# Altium footprint library UltraZOhm_CarrierBoard.PcbLib: 71 footprints (part 4 of 5)
Each footprint in its own frame and in the unit in brackets; x right, y up, seen from the top. Pads: shape width x height; smd on the part's side, far side on the other; paste and mask are expansions set on the pad; w line width, h text height; cw(c..) or ccw(c..) is an arc to the next point about the centre after c.
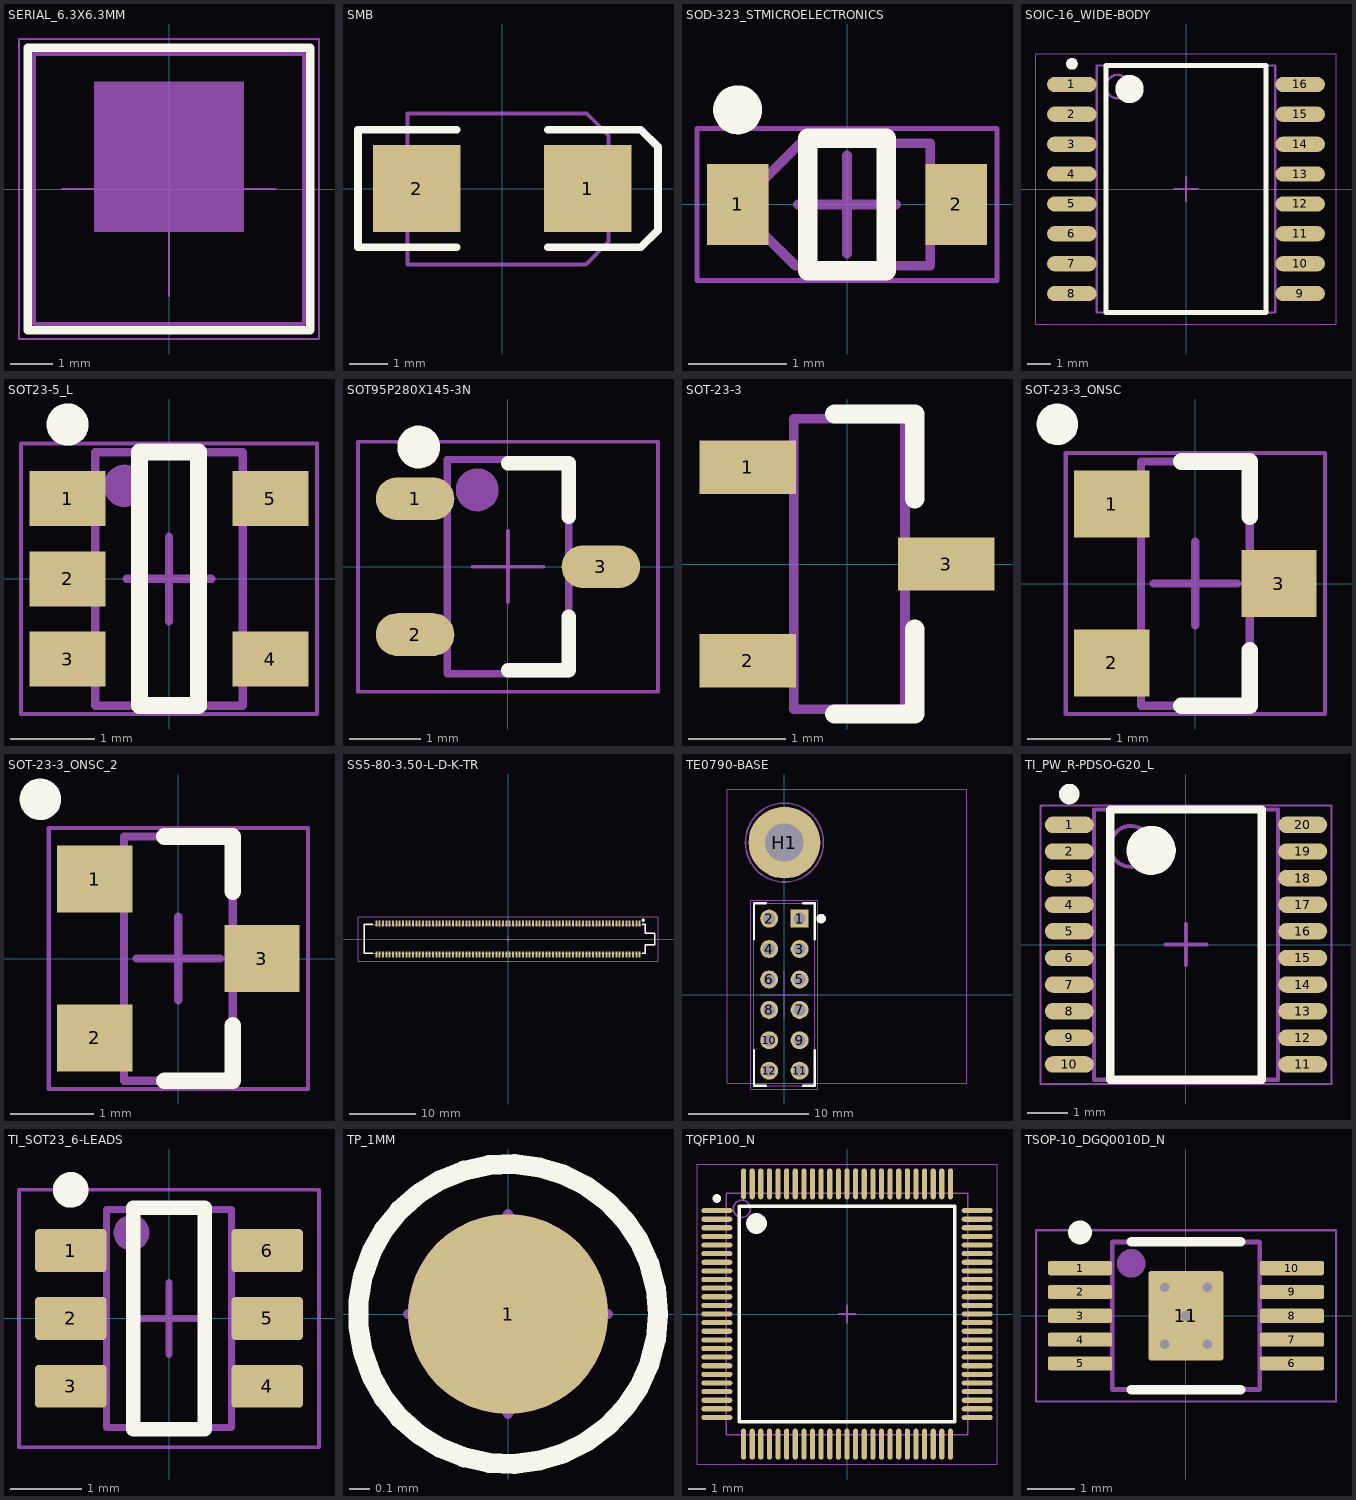
[diagram p3: the footprints below, top view; thin cyan lines are the x and y axes]

## SERIAL_6.3X6.3MM [mm]
Top Overlay:
  lines w0.2: -3.3,-3.3 -3.3,3.3 3.3,3.3 3.3,-3.3 -3.3,-3.3
Mechanical 5:
  region: -1.75,2.5 -1.75,-1 1.75,-1 1.75,2.5
  lines w0.1: -3.15,-3.15 3.15,-3.15 3.15,3.15 -3.15,3.15 -3.15,-3.15
  text "SerialNr" at 2.5,-1.7 h0.7
Mechanical 15:
  lines w0.05: -2.5,0 2.5,0 ; 0,-2.5 0,2.5 ; -3.5,-3.5 -3.5,3.5 3.5,3.5 3.5,-3.5 -3.5,-3.5

## SMB [mm]
pads (2):
  rect 2.3x2.3 smd: 1(2.25,0) 2(-2.25,0)
Top Overlay:
  lines w0.2: -1.2,-1.55 -3.8,-1.55 -3.8,1.55 -1.2,1.55 ; 1.2,-1.55 3.65,-1.55 4.1,-1.1 4.1,1.1 3.65,1.55 1.2,1.55
Mechanical 5:
  lines w0.1: -2.5,-2 2.2,-2 2.8,-1.4 2.8,1.4 2.225,1.975 -2.5,1.975 -2.5,-2
  text ".Designator" at -1.824,-0.8 h1.52
3D body "DIOM4336X25N.step": height 2.47, standoff 0, extent -2.52,-1.975 2.52,1.975

## SOD-323_STMICROELECTRONICS [mm]
pads (2):
  rect 0.63x0.83 smd: 1(-1.115,0) 2(1.115,0)
Top Overlay:
  circle w0.25: c-1.115,0.965 r0.125
  lines w0.2: -0.4,-0.675 0.4,-0.675 0.4,0.675 -0.4,0.675 -0.4,-0.675
Mechanical 5:
  lines w0.1: -0.85,-0.3 -0.85,0.25 -0.475,0.625 0.85,0.625 0.85,-0.625 -0.525,-0.625 -0.85,-0.3
  text ".Designator" at -0.624,-0.3 h0.51
Mechanical 15:
  lines w0.05: -1.53,-0.775 1.53,-0.775 1.53,0.775 -1.53,0.775 -1.53,-0.775
  lines w0.1: -0.5,0 0.5,0 ; 0,-0.5 0,0.5
3D body: height 1.06, standoff 0, extent -0.85,-0.625 0.85,0.625

## SOIC-16_WIDE-BODY [mm]
pads (16):
  oval 2.1x0.65 smd: 1(-4.85,4.445) 2(-4.85,3.175) 3(-4.85,1.905) 4(-4.85,0.635) 5(-4.85,-0.635) 6(-4.85,-1.905) 7(-4.85,-3.175) 8(-4.85,-4.445) 9(4.85,-4.445) 10(4.85,-3.175) 11(4.85,-1.905) 12(4.85,-0.635) 13(4.85,0.635) 14(4.85,1.905) 15(4.85,3.175) 16(4.85,4.445)
Top Overlay:
  circle w0.6: c-2.4,4.25 r0.3
  circle w0.25: c-4.85,5.32 r0.125
  lines w0.2: -3.4,-5.25 3.4,-5.25 3.4,5.25 -3.4,5.25 -3.4,-5.25
Mechanical 5:
  circle w0.1: c-2.9,4.35 r0.5
  lines w0.1: -3.8,-5.25 3.8,-5.25 3.8,5.25 -3.8,5.25 -3.8,-5.25
  text ".Designator" at 0.316,-2.048 h1.52
Mechanical 15:
  lines w0.05: -6.375,-5.75 6.375,-5.75 6.375,5.75 -6.375,5.75 -6.375,-5.75
  lines w0.1: -0.5,0 0.5,0 ; 0,-0.5 0,0.5
3D body "SOIC127P1030X265-16M.step": height 2.65, standoff 0, extent -5.162,-5.25 5.163,5.25

## SOT23-5_L [mm]
pads (5):
  rect 0.9x0.65 smd: 1(-1.2,0.95) 2(-1.2,0) 3(-1.2,-0.95) 4(1.2,-0.95) 5(1.2,0.95)
Top Overlay:
  circle w0.25: c-1.2,1.825 r0.125
  lines w0.2: -0.35,-1.5 -0.35,1.5 0.35,1.5 0.35,-1.5 -0.35,-1.5
Mechanical 5:
  circle w0.25: c-0.525,1.1 r0.125
  lines w0.05: -0.85,-1.15 -1.5,-1.15 -1.5,-0.75 -0.85,-0.75 ; -0.85,-0.2 -1.5,-0.2 -1.5,0.2 -0.85,0.2 ; -0.85,0.75 -1.5,0.75 -1.5,1.15 -0.85,1.15 ; 0.85,-1.15 1.5,-1.15 1.5,-0.75 0.85,-0.75 ; 0.85,0.75 1.5,0.75 1.5,1.15 0.85,1.15
  lines w0.1: -0.875,-1.5 0.875,-1.5 0.875,1.5 -0.875,1.5 -0.875,-1.5
  text ".Designator" at 0.4,-1.324 h0.76
Mechanical 15:
  lines w0.05: -1.75,-1.6 1.75,-1.6 1.75,1.6 -1.75,1.6 -1.75,-1.6
  lines w0.1: -0.5,0 0.5,0 ; 0,-0.5 0,0.5
3D body: height 1.45, standoff 0, extent -0.875,-1.5 0.875,1.5

## SOT95P280X145-3N [mm]
pads (3):
  oval 1.1x0.6 smd: 1(-1.3,0.95) 2(-1.3,-0.95) 3(1.3,0)
Top Overlay:
  circle w0.3: c-1.25,1.675 r0.15
  lines w0.2: 0,-1.45 0.85,-1.45 0.85,-0.7 ; 0,1.45 0.85,1.45 0.85,0.7
Mechanical 5:
  circle w0.3: c-0.43,1.075 r0.15
  lines w0.05: -0.85,-1.15 -1.675,-1.15 -1.675,-0.75 -0.85,-0.75 ; -0.85,0.75 -1.675,0.75 -1.675,1.15 -0.85,1.15 ; 0.85,-0.2 1.675,-0.2 1.675,0.2 0.85,0.2
  lines w0.1: -0.85,-1.5 -0.85,1.5 0.85,1.5 0.85,-1.5 -0.85,-1.5
  text ".Designator" at 0.4,-1.224 h0.76
Mechanical 15:
  lines w0.05: -0.5,0 0.5,0 ; 0,-0.5 0,0.5 ; -2.1,-1.75 -2.1,1.75 2.1,1.75 2.1,-1.75 -2.1,-1.75
3D body "SW3dPS-3-lead sot23-3.STEP": height 1.01, standoff -0.01, extent -1.25,-1.46 1.226,1.46

## SOT-23-3 [mm]
pads (3):
  rect 1x0.55 smd: 1(-1.025,1) 2(-1.025,-1) 3(1.025,0)
Top Overlay:
  lines w0.2: -0.125,-1.55 0.7,-1.55 0.7,-0.675 ; -0.125,1.55 0.7,1.55 0.7,0.675
Mechanical 5:
  lines w0.05: -0.55,-1.2 -1.375,-1.2 -1.375,-0.8 -0.55,-0.8 ; -0.55,0.8 -1.375,0.8 -1.375,1.2 -0.55,1.2 ; 0.6,-0.2 1.375,-0.2 1.375,0.2 0.6,0.2
  lines w0.1: -0.55,-1.5 0.6,-1.5 0.6,1.5 -0.55,1.5 -0.55,-1.5
  text ".Designator" at 0.4,-1.224 h0.76
3D body "User Library-SOT-23-3-1.STEP": height 1.1, standoff 0, extent -1.247,-1.5 1.295,1.5

## SOT-23-3_ONSC [mm]
pads (3):
  rect 0.9x0.8 smd: 1(-1,0.95) 2(-1,-0.95) 3(1,0)
Top Overlay:
  circle w0.25: c-1.651,1.905 r0.123
  lines w0.2: -0.165,-1.46 0.65,-1.46 0.65,-0.8 ; -0.165,1.46 0.65,1.46 0.65,0.8
Mechanical 5:
  lines w0.05: -0.65,-1.2 -1.3,-1.2 -1.3,-0.8 -0.65,-0.8 ; -0.65,0.8 -1.3,0.8 -1.3,1.2 -0.65,1.2 ; 0.65,-0.2 1.3,-0.2 1.3,0.2 0.65,0.2
  lines w0.1: -0.65,-1.46 0.65,-1.46 0.65,1.46 -0.65,1.46 -0.65,-1.46
  text ".Designator" at 0.4,-0.624 h0.76
Mechanical 15:
  lines w0.05: -1.55,-1.56 1.55,-1.56 1.55,1.56 -1.55,1.56 -1.55,-1.56
  lines w0.1: -0.5,0 0.5,0 ; 0,-0.5 0,0.5
3D body: height 1.11, standoff 0.01, extent -0.65,-1.46 0.65,1.46

## SOT-23-3_ONSC_2 [mm]
pads (3):
  rect 0.9x0.8 smd: 1(-1,0.95) 2(-1,-0.95) 3(1,0)
Top Overlay:
  circle w0.25: c-1.651,1.905 r0.123
  lines w0.2: -0.165,-1.46 0.65,-1.46 0.65,-0.8 ; -0.165,1.46 0.65,1.46 0.65,0.8
Mechanical 5:
  lines w0.05: -0.65,-1.2 -1.3,-1.2 -1.3,-0.8 -0.65,-0.8 ; -0.65,0.8 -1.3,0.8 -1.3,1.2 -0.65,1.2 ; 0.65,-0.2 1.3,-0.2 1.3,0.2 0.65,0.2
  lines w0.1: -0.65,-1.46 0.65,-1.46 0.65,1.46 -0.65,1.46 -0.65,-1.46
  text ".Designator" at 0.4,-1.224 h0.76
Mechanical 15:
  lines w0.05: -1.55,-1.56 1.55,-1.56 1.55,1.56 -1.55,1.56 -1.55,-1.56
  lines w0.1: -0.5,0 0.5,0 ; 0,-0.5 0,0.5
3D body: height 1.11, standoff 0.01, extent -0.65,-1.46 0.65,1.46

## SS5-80-3.50-L-D-K-TR [mm]
pads (160):
  rrect20% 0.3x0.93 smd mask+0.05: 1(19.75,2.335) 2(19.75,-2.335) 3(19.25,2.335) 4(19.25,-2.335) 5(18.75,2.335) 6(18.75,-2.335) 7(18.25,2.335) 8(18.25,-2.335) 9(17.75,2.335) 10(17.75,-2.335) 11(17.25,2.335) 12(17.25,-2.335) 13(16.75,2.335) 14(16.75,-2.335) 15(16.25,2.335) 16(16.25,-2.335) 17(15.75,2.335) 18(15.75,-2.335) 19(15.25,2.335) 20(15.25,-2.335) 21(14.75,2.335) 22(14.75,-2.335) 23(14.25,2.335) 24(14.25,-2.335) 25(13.75,2.335) 26(13.75,-2.335) 27(13.25,2.335) 28(13.25,-2.335) 29(12.75,2.335) 30(12.75,-2.335) 31(12.25,2.335) 32(12.25,-2.335) 33(11.75,2.335) 34(11.75,-2.335) 35(11.25,2.335) 36(11.25,-2.335) 37(10.75,2.335) 38(10.75,-2.335) 39(10.25,2.335) 40(10.25,-2.335) 41(9.75,2.335) 42(9.75,-2.335) 43(9.25,2.335) 44(9.25,-2.335) 45(8.75,2.335) 46(8.75,-2.335) 47(8.25,2.335) 48(8.25,-2.335) 49(7.75,2.335) 50(7.75,-2.335) 51(7.25,2.335) 52(7.25,-2.335) 53(6.75,2.335) 54(6.75,-2.335) 55(6.25,2.335) 56(6.25,-2.335) 57(5.75,2.335) 58(5.75,-2.335) 59(5.25,2.335) 60(5.25,-2.335) 61(4.75,2.335) 62(4.75,-2.335) 63(4.25,2.335) 64(4.25,-2.335) 65(3.75,2.335) 66(3.75,-2.335) 67(3.25,2.335) 68(3.25,-2.335) 69(2.75,2.335) 70(2.75,-2.335) 71(2.25,2.335) 72(2.25,-2.335) 73(1.75,2.335) 74(1.75,-2.335) 75(1.25,2.335) 76(1.25,-2.335) 77(0.75,2.335) 78(0.75,-2.335) 79(0.25,2.335) 80(0.25,-2.335) 81(-0.25,2.335) 82(-0.25,-2.335) 83(-0.75,2.335) 84(-0.75,-2.335) 85(-1.25,2.335) 86(-1.25,-2.335) 87(-1.75,2.335) 88(-1.75,-2.335) 89(-2.25,2.335) 90(-2.25,-2.335) 91(-2.75,2.335) 92(-2.75,-2.335) 93(-3.25,2.335) 94(-3.25,-2.335) 95(-3.75,2.335) 96(-3.75,-2.335) 97(-4.25,2.335) 98(-4.25,-2.335) 99(-4.75,2.335) 100(-4.75,-2.335) 101(-5.25,2.335) 102(-5.25,-2.335) 103(-5.75,2.335) 104(-5.75,-2.335) 105(-6.25,2.335) 106(-6.25,-2.335) 107(-6.75,2.335) 108(-6.75,-2.335) 109(-7.25,2.335) 110(-7.25,-2.335) 111(-7.75,2.335) 112(-7.75,-2.335) 113(-8.25,2.335) 114(-8.25,-2.335) 115(-8.75,2.335) 116(-8.75,-2.335) 117(-9.25,2.335) 118(-9.25,-2.335) 119(-9.75,2.335) 120(-9.75,-2.335) 121(-10.25,2.335) 122(-10.25,-2.335) 123(-10.75,2.335) 124(-10.75,-2.335) 125(-11.25,2.335) 126(-11.25,-2.335) 127(-11.75,2.335) 128(-11.75,-2.335) 129(-12.25,2.335) 130(-12.25,-2.335) 131(-12.75,2.335) 132(-12.75,-2.335) 133(-13.25,2.335) 134(-13.25,-2.335) 135(-13.75,2.335) 136(-13.75,-2.335) 137(-14.25,2.335) 138(-14.25,-2.335) 139(-14.75,2.335) 140(-14.75,-2.335) 141(-15.25,2.335) 142(-15.25,-2.335) 143(-15.75,2.335) 144(-15.75,-2.335) 145(-16.25,2.335) 146(-16.25,-2.335) 147(-16.75,2.335) 148(-16.75,-2.335) 149(-17.25,2.335) 150(-17.25,-2.335) 151(-17.75,2.335) 152(-17.75,-2.335) 153(-18.25,2.335) 154(-18.25,-2.335) 155(-18.75,2.335) 156(-18.75,-2.335) 157(-19.25,2.335) 158(-19.25,-2.335) 159(-19.75,2.335) 160(-19.75,-2.335)
Top Overlay:
  circle w0.25: c20.3,2.81 r0.125
  lines w0.2: -20.3,-2.175 -21.571,-2.175 -21.571,2.175 -20.3,2.175 ; 20.15,-2.175 20.58,-2.175 20.58,-0.9 21.98,-0.9 21.98,0.9 20.58,0.9 20.58,2.175 20.15,2.175
Mechanical 5:
  lines w0.1: -21.56,-2.175 20.58,-2.175 20.58,-1.3 cw(c20.98,-1.3) 20.98,-0.9 21.83,-0.9 ccw(c21.83,-0.75) 21.98,-0.75 21.98,0.75 ccw(c21.83,0.75) 21.83,0.9 20.98,0.9 cw(c20.98,1.3) 20.58,1.3 20.58,2.175 -21.56,2.175 -21.56,-2.175
  text ".Designator" at 0.949,0.975 h1.52
  text "1" at 19.999,1.625 h0.6
  text "2" at 20.149,-1.15 h0.6
  text "159" at -19.451,1.6 h0.6
  text "160" at -19.451,-0.975 h0.6
Mechanical 15:
  lines w0.05: -0.5,0 0.5,0 ; 0,-0.5 0,0.5 ; -22.5,-3.3 22.5,-3.3 22.5,3.3 -22.5,3.3 -22.5,-3.3
3D body "SS5-80-3.50-D-K-TR.stp": height 4.03, standoff 0.03, extent -21.56,-2.5 21.98,2.5

## TE0790-BASE [mm]
pads (13):
  rect 1.5x1.5 hole 1: 1(1.27,6.35)
  round 1.5 hole 1: 2(-1.27,6.35) 3(1.27,3.81) 4(-1.27,3.81) 5(1.27,1.27) 6(-1.27,1.27) 7(1.27,-1.27) 8(-1.27,-1.27) 9(1.27,-3.81) 10(-1.27,-3.81) 11(1.27,-6.35) 12(-1.27,-6.35)
  round 6 hole 3.2: H1(0,12.7)
Top Overlay:
  circle w0.4: c3.07,6.35 r0.2
  lines w0.2: -2.54,-4.62 -2.54,-7.62 -1.56,-7.62 ; -2.54,4.62 -2.54,7.62 -1.56,7.62 ; 1.56,-7.62 2.54,-7.62 2.54,-4.62 ; 1.56,7.62 2.54,7.62 2.54,4.62
Mechanical 5:
  circle w0.1: c0,12.7 r3.25
  circle w0.1: c0,12.7 r1.6
  lines w0.1: -2.54,-7.62 -2.54,7.62 2.54,7.62 2.54,-7.62 -2.54,-7.62
  text ".Designator" at -0.65,1.05 h1.52
  text "1" at 1,6.73 h1
  text "2" at -2,6.73 h1
  text "12" at -2,-5.23 h1
  text "11" at 1,-5.23 h1
Mechanical 11:
  lines w0.1: -4.78,-7.38 -4.78,17.174 15.24,17.174 15.24,-7.38 -4.78,-7.38
Mechanical 14:
  circle w0.1: c0,12.7 r1.6
  circle w0.1: c0,12.7 r3.25
Mechanical 15:
  circle w0.05: c0,12.7 r3.3
  lines w0.05: -2,0 2,0 ; -1,12.7 1,12.7 ; 0,-2 0,2 ; 0,11.7 0,13.7 ; -2.8,-7.88 -2.8,7.88 2.8,7.88 2.8,-7.88 -2.8,-7.88
Mechanical 16:
  circle w0.05: c0,12.7 r3.3
3D body "TE0790-01.step": height 14.23, standoff 2.57, extent -4.78,-7.62 15.24,18.697
3D body "female_header_a-bl254-dg-g12d.stp": height 8.5, standoff -3.2, extent -2.5,-7.745 2.5,7.745

## TI_PW_R-PDSO-G20_L [mm]
pads (20):
  oval 1.2x0.4 smd: 1(-2.85,2.925) 2(-2.85,2.275) 3(-2.85,1.625) 4(-2.85,0.975) 5(-2.85,0.325) 6(-2.85,-0.325) 7(-2.85,-0.975) 8(-2.85,-1.625) 9(-2.85,-2.275) 10(-2.85,-2.925) 11(2.85,-2.925) 12(2.85,-2.275) 13(2.85,-1.625) 14(2.85,-0.975) 15(2.85,-0.325) 16(2.85,0.325) 17(2.85,0.975) 18(2.85,1.625) 19(2.85,2.275) 20(2.85,2.925)
Top Overlay:
  circle w0.25: c-2.85,3.675 r0.125
  circle w0.6: c-0.85,2.3 r0.3
  lines w0.2: -1.85,-3.3 -1.85,3.3 1.85,3.3 1.85,-3.3 -1.85,-3.3
Mechanical 5:
  circle w0.1: c-1.35,2.4 r0.5
  lines w0.1: -2.25,-3.3 -2.25,3.3 2.25,3.3 2.25,-3.3 -2.25,-3.3
  text ".Designator" at -3.05,-4.775 h1
Mechanical 15:
  lines w0.05: -3.55,-3.4 -3.55,3.4 3.55,3.4 3.55,-3.4 -3.55,-3.4
  lines w0.1: -0.5,0 0.5,0 ; 0,-0.5 0,0.5
3D body "PW0020AakaMTC20.stp": height 1, standoff 0, extent -3.21,-3.25 3.21,3.25

## TI_SOT23_6-LEADS [mm]
pads (6):
  rrect17% 1x0.6 smd: 1(-1.375,0.95) 2(-1.375,0) 3(-1.375,-0.95) 4(1.375,-0.95) 5(1.375,0) 6(1.375,0.95)
Top Overlay:
  circle w0.25: c-1.375,1.8 r0.125
  lines w0.2: -0.5,-1.55 0.5,-1.55 0.5,1.55 -0.5,1.55 -0.5,-1.55
Mechanical 5:
  circle w0.25: c-0.525,1.2 r0.125
  lines w0.1: -0.875,-1.525 -0.875,1.525 0.875,1.525 0.875,-1.525 -0.875,-1.525
  text ".Designator" at -0.183,0.929 h0.76
Mechanical 15:
  lines w0.05: -2.1,-1.8 -2.1,1.8 2.1,1.8 2.1,-1.8 -2.1,-1.8
  lines w0.1: -0.5,0 0.5,0 ; 0,-0.5 0,0.5
3D body "DBV0006AakaMF06A.stp": height 1.11, standoff -0.01, extent -1.422,-1.461 1.422,1.46

## TP_1MM [mm]
pads (1):
  round 1 smd paste-1: 1(0,0)
Top Overlay:
  circle w0.1: c0,0 r0.75
Mechanical 5:
  circle w0.6: c0,0 r0.2
Mechanical 15:
  circle w0.05: c0,0 r0.75
  lines w0.05: -0.5,0 0.5,0 ; 0,-0.5 0,0.5

## TQFP100_N [mm]
pads (100):
  oval 1.8x0.3 smd: 1(-7.55,6) 2(-7.55,5.5) 3(-7.55,5) 4(-7.55,4.5) 5(-7.55,4) 6(-7.55,3.5) 7(-7.55,3) 8(-7.55,2.5) 9(-7.55,2) 10(-7.55,1.5) 11(-7.55,1) 12(-7.55,0.5) 13(-7.55,0) 14(-7.55,-0.5) 15(-7.55,-1) 16(-7.55,-1.5) 17(-7.55,-2) 18(-7.55,-2.5) 19(-7.55,-3) 20(-7.55,-3.5) 21(-7.55,-4) 22(-7.55,-4.5) 23(-7.55,-5) 24(-7.55,-5.5) 25(-7.55,-6) 51(7.55,-6) 52(7.55,-5.5) 53(7.55,-5) 54(7.55,-4.5) 55(7.55,-4) 56(7.55,-3.5) 57(7.55,-3) 58(7.55,-2.5) 59(7.55,-2) 60(7.55,-1.5) 61(7.55,-1) 62(7.55,-0.5) 63(7.55,0) 64(7.55,0.5) 65(7.55,1) 66(7.55,1.5) 67(7.55,2) 68(7.55,2.5) 69(7.55,3) 70(7.55,3.5) 71(7.55,4) 72(7.55,4.5) 73(7.55,5) 74(7.55,5.5) 75(7.55,6)
  oval 0.3x1.8 smd: 26(-6,-7.55) 27(-5.5,-7.55) 28(-5,-7.55) 29(-4.5,-7.55) 30(-4,-7.55) 31(-3.5,-7.55) 32(-3,-7.55) 33(-2.5,-7.55) 34(-2,-7.55) 35(-1.5,-7.55) 36(-1,-7.55) 37(-0.5,-7.55) 38(0,-7.55) 39(0.5,-7.55) 40(1,-7.55) 41(1.5,-7.55) 42(2,-7.55) 43(2.5,-7.55) 44(3,-7.55) 45(3.5,-7.55) 46(4,-7.55) 47(4.5,-7.55) 48(5,-7.55) 49(5.5,-7.55) 50(6,-7.55) 76(6,7.55) 77(5.5,7.55) 78(5,7.55) 79(4.5,7.55) 80(4,7.55) 81(3.5,7.55) 82(3,7.55) 83(2.5,7.55) 84(2,7.55) 85(1.5,7.55) 86(1,7.55) 87(0.5,7.55) 88(0,7.55) 89(-0.5,7.55) 90(-1,7.55) 91(-1.5,7.55) 92(-2,7.55) 93(-2.5,7.55) 94(-3,7.55) 95(-3.5,7.55) 96(-4,7.55) 97(-4.5,7.55) 98(-5,7.55) 99(-5.5,7.55) 100(-6,7.55)
Top Overlay:
  circle w0.6: c-5.25,5.25 r0.3
  circle w0.25: c-7.55,6.7 r0.125
  lines w0.2: -6.25,-6.25 6.25,-6.25 6.25,6.25 -6.25,6.25 -6.25,-6.25
Mechanical 5:
  circle w0.1: c-6.1,6.1 r0.5
  lines w0.1: -7,-7 7,-7 7,7 -7,7 -7,-7
  text ".Designator" at 2.41,0.475 h1.52
Mechanical 15:
  lines w0.05: -8.7,-8.7 8.7,-8.7 8.7,8.7 -8.7,8.7 -8.7,-8.7
  lines w0.1: -0.5,0 0.5,0 ; 0,-0.5 0,0.5
3D body: height 1.6, standoff 0, extent -7,-7 7,7

## TSOP-10_DGQ0010D_N [mm]
pads (11):
  rrect33% 1.35x0.3 smd: 1(-2.225,1) 2(-2.225,0.5) 3(-2.225,0) 4(-2.225,-0.5) 5(-2.225,-1) 6(2.225,-1) 7(2.225,-0.5) 8(2.225,0) 9(2.225,0.5) 10(2.225,1)
  rrect6% 1.57x1.88 smd: 11(0,0)
via -0.45,0.6 diameter 0.5 hole 0.2
via -0.45,-0.6 diameter 0.5 hole 0.2
via 0.45,-0.6 diameter 0.5 hole 0.2
via 0.45,0.6 diameter 0.5 hole 0.2
via 0,0 diameter 0.5 hole 0.2
Top Overlay:
  circle w0.25: c-2.225,1.75 r0.125
  lines w0.2: -1.15,-1.55 1.15,-1.55 ; -1.15,1.55 1.15,1.55
Mechanical 5:
  circle w0.3: c-1.15,1.1 r0.15
  lines w0.1: -1.55,-1.55 -1.55,1.55 1.55,1.55 1.55,-1.55 -1.55,-1.55
  text ".Designator" at -1.197,-0.854 h0.76
Mechanical 15:
  lines w0.05: -3.15,-1.8 -3.15,1.8 3.15,1.8 3.15,-1.8 -3.15,-1.8
  lines w0.1: -0.5,0 0.5,0 ; 0,-0.5 0,0.5
3D body "DGQ0010.stp": height 0.94, standoff -0.02, extent -2.451,-1.499 2.451,1.499